# Altium footprint library 13-IC Packages-2smt4e.PcbLib: 49 footprints (part 1 of 4)
Each footprint in its own frame and in the unit in brackets; x right, y up, seen from the top. Pads: shape width x height; smd on the part's side, far side on the other; paste and mask are expansions set on the pad; w line width, h text height; cw(c..) or ccw(c..) is an arc to the next point about the centre after c.
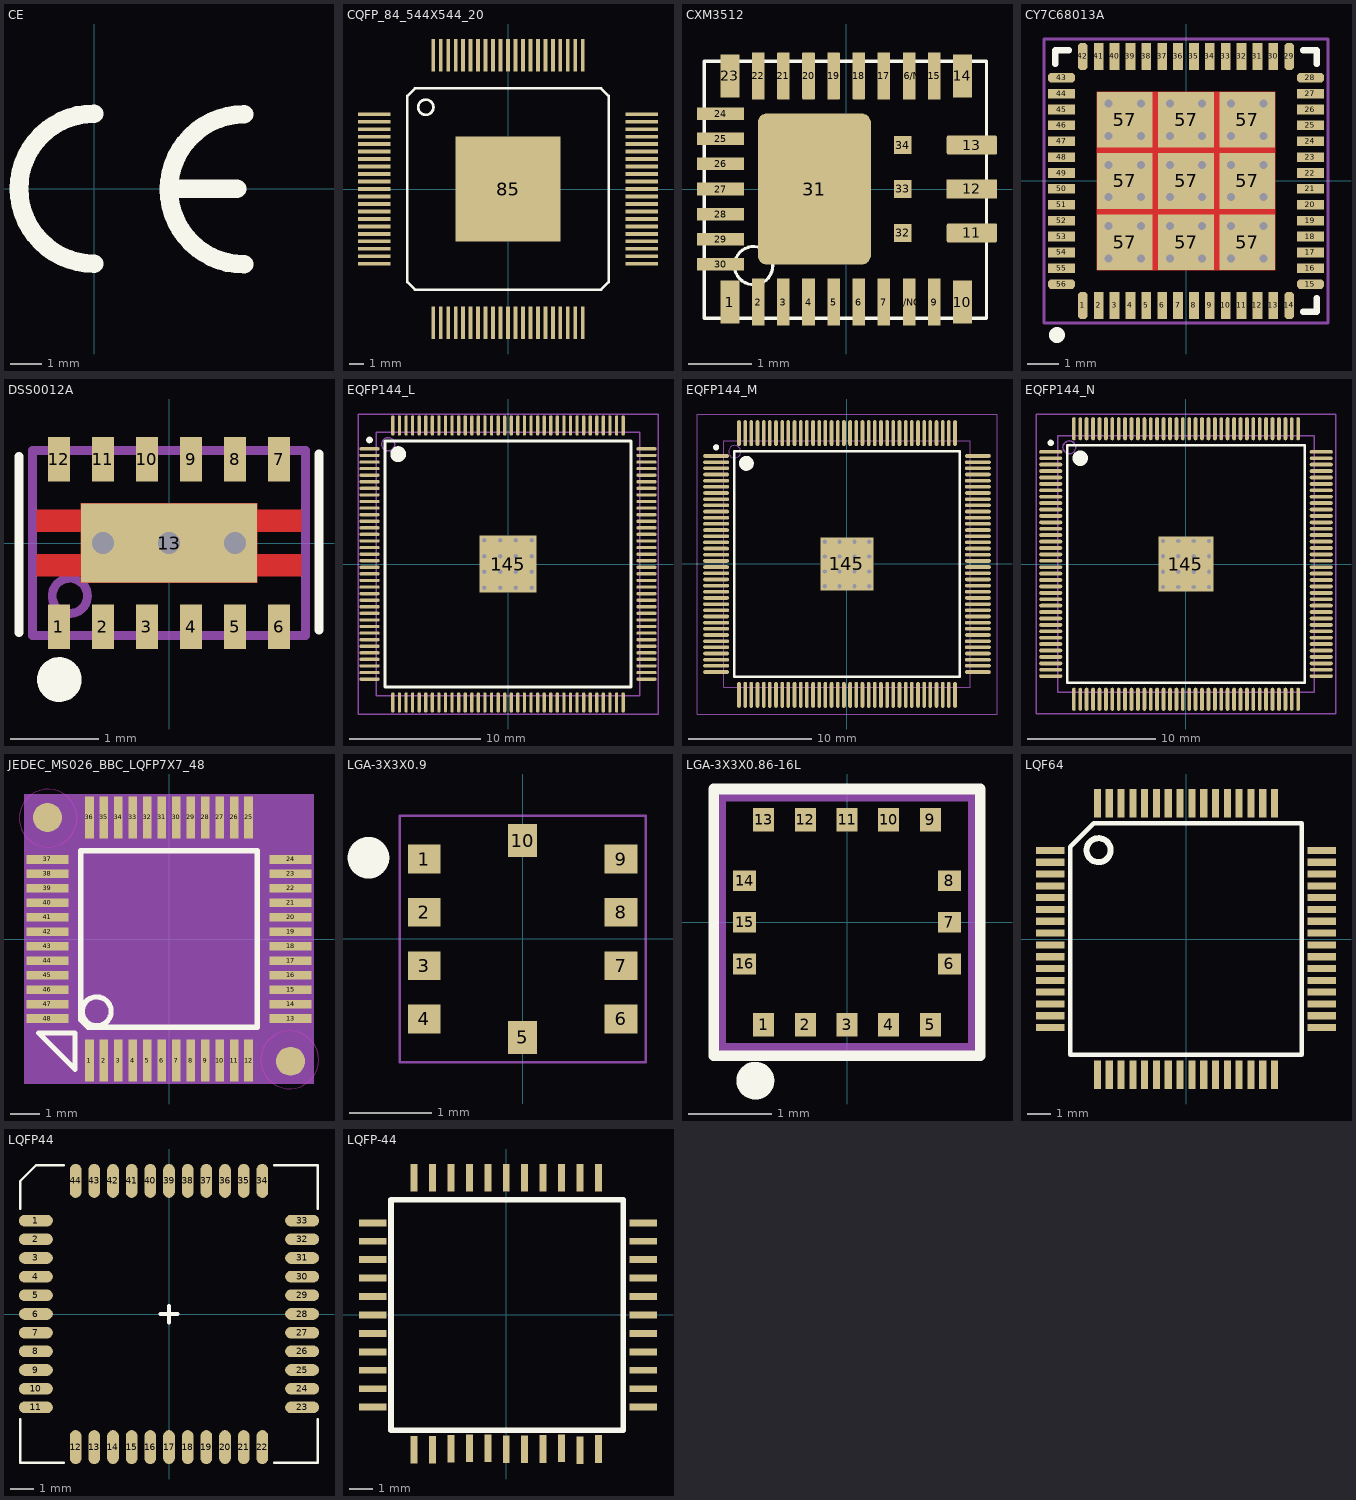
[diagram p0: the footprints below, top view; thin cyan lines are the x and y axes]

## CE [mm]
Top Overlay:
  lines w0.6: 0,-2.413 cw(c0,0) 0,2.413 ; 2.53,0 4.6,0 ; 4.826,-2.438 cw(c4.826,-0.025) 4.826,2.388
3D body "ce.stp": height 0.02, standoff 0, extent -2.725,-2.725 4.82,2.725

## CQFP_84_544X544_20 [mil] "CQFP_84_544X544_20"
pads (85):
  rect 85x10 smd mask+2.76: 1(-352.5,196.85) 2(-352.5,177.16) 3(-352.5,157.48) 4(-352.5,137.79) 5(-352.5,118.11) 6(-352.5,98.42) 7(-352.5,78.74) 8(-352.5,59.05) 9(-352.5,39.37) 10(-352.5,19.68) 11(-352.5,0) 12(-352.5,-19.68) 13(-352.5,-39.37) 14(-352.5,-59.05) 15(-352.5,-78.74) 16(-352.5,-98.42) 17(-352.5,-118.11) 18(-352.5,-137.79) 19(-352.5,-157.48) 20(-352.5,-177.16) 21(-352.5,-196.85) 43(352.5,-196.85) 44(352.5,-177.16) 45(352.5,-157.48) 46(352.5,-137.79) 47(352.5,-118.11) 48(352.5,-98.42) 49(352.5,-78.74) 50(352.5,-59.05) 51(352.5,-39.37) 52(352.5,-19.68) 53(352.5,0) 54(352.5,19.68) 55(352.5,39.37) 56(352.5,59.05) 57(352.5,78.74) 58(352.5,98.42) 59(352.5,118.11) 60(352.5,137.79) 61(352.5,157.48) 62(352.5,177.16) 63(352.5,196.85)
  rect 10x85 smd mask+2.76: 22(-196.85,-352.5) 23(-177.16,-352.5) 24(-157.48,-352.5) 25(-137.79,-352.5) 26(-118.11,-352.5) 27(-98.42,-352.5) 28(-78.74,-352.5) 29(-59.05,-352.5) 30(-39.37,-352.5) 31(-19.68,-352.5) 32(0,-352.5) 33(19.68,-352.5) 34(39.37,-352.5) 35(59.05,-352.5) 36(78.74,-352.5) 37(98.42,-352.5) 38(118.11,-352.5) 39(137.79,-352.5) 40(157.48,-352.5) 41(177.16,-352.5) 42(196.85,-352.5) 64(196.85,352.5) 65(177.16,352.5) 66(157.48,352.5) 67(137.79,352.5) 69(98.42,352.5) 70(78.74,352.5) 71(59.05,352.5) 72(39.37,352.5) 73(19.68,352.5) 74(0,352.5) 75(-19.68,352.5) 76(-39.37,352.5) 77(-59.05,352.5) 78(-78.74,352.5) 79(-98.42,352.5) 80(-118.11,352.5) 81(-137.79,352.5) 82(-157.48,352.5) 83(-177.16,352.5) 84(-196.85,352.5)
  rect 10x85 smd: 68(118.11,352.5)
  rect 277x277 smd mask+2.76: 85(0,0)
Top Overlay:
  circle w7: c-216.38,215.31 r20
  lines w7: -265,-245 -265,245 -245,265 245,265 265,245 265,-245 245,-265 -245,-265 -265,-245
Top Paste:
  pour cut-out: -130,-130 -130,-10 -10,-10 -10,-130
  pour cut-out: 10,-10 10,-130 130,-130 130,-10
  pour cut-out: 130,130 130,10 10,10 10,130
  pour cut-out: -10,10 -10,130 -130,130 -130,10
Mechanical 16:
  circle w1: c-217.16,216.1 r19.68
3D body "cqfp-84.stp": height 0.79, standoff 0, extent -202,-394.99 -192,-309.99
3D body "cqfp-84.stp": height 0.79, standoff 0, extent -182,-395 -172.01,-310
3D body "cqfp-84.stp": height 0.79, standoff 0, extent -162.5,-395 -152.51,-310
3D body "cqfp-84.stp": height 0.79, standoff 0, extent -143,-394.99 -133,-310
3D body "cqfp-84.stp": height 0.79, standoff 0, extent -123,-394.99 -113,-309.99
3D body "cqfp-84.stp": height 0.79, standoff 0, extent -103.5,-394.99 -93.5,-309.99
3D body "cqfp-84.stp": height 0.79, standoff 0, extent -84,-394.99 -74,-310
3D body "cqfp-84.stp": height 0.79, standoff 0, extent -64,-395 -54,-310
3D body "cqfp-84.stp": height 0.79, standoff 0, extent -44.5,-394.99 -34.5,-310
3D body "cqfp-84.stp": height 0.79, standoff 0, extent -25,-395 -15.01,-310
3D body "cqfp-84.stp": height 0.79, standoff 0, extent -5,-395 4.99,-310
3D body "cqfp-84.stp": height 0.79, standoff 0, extent 14.5,-394.99 24.5,-309.99
3D body "cqfp-84.stp": height 0.79, standoff 0, extent 34.5,-394.99 44.5,-309.99
3D body "cqfp-84.stp": height 0.79, standoff 0, extent 54,-395 63.99,-310
3D body "cqfp-84.stp": height 0.79, standoff 0, extent 73.5,-395 83.49,-310
3D body "cqfp-84.stp": height 0.79, standoff 0, extent 93.5,-395 103.5,-310
3D body "cqfp-84.stp": height 0.79, standoff 0, extent 113,-395 123,-310
3D body "cqfp-84.stp": height 0.79, standoff 0, extent 132.5,-394.99 142.5,-310
3D body "cqfp-84.stp": height 0.79, standoff 0, extent 152.5,-394.99 162.5,-310
3D body "cqfp-84.stp": height 0.79, standoff 0, extent 172,-394.99 182,-309.99
3D body "cqfp-84.stp": height 0.79, standoff 0, extent 192,-395 202,-310
3D body "cqfp-84.stp": height 0.79, standoff 0, extent 192,310.01 202,395.01
3D body "cqfp-84.stp": height 0.79, standoff 0, extent 172,310.01 182,395
3D body "cqfp-84.stp": height 0.79, standoff 0, extent 152.5,310.01 162.5,395.01
3D body "cqfp-84.stp": height 0.79, standoff 0, extent 133,310 142.99,395
3D body "cqfp-84.stp": height 0.79, standoff 0, extent 113,310.01 123,395.01
3D body "cqfp-84.stp": height 0.79, standoff 0, extent 93.5,310 103.5,395
3D body "cqfp-84.stp": height 0.79, standoff 0, extent 73.5,310 83.49,395
3D body "cqfp-84.stp": height 0.79, standoff 0, extent 54,310.01 64,395
3D body "cqfp-84.stp": height 0.79, standoff 0, extent 34.5,310 44.5,395
3D body "cqfp-84.stp": height 0.79, standoff 0, extent 14.5,310.01 24.49,395
3D body "cqfp-84.stp": height 0.79, standoff 0, extent -5,310 5,395
3D body "cqfp-84.stp": height 0.79, standoff 0, extent -24.5,310 -14.5,395
3D body "cqfp-84.stp": height 0.79, standoff 0, extent -44.5,310 -34.5,395
3D body "cqfp-84.stp": height 0.79, standoff 0, extent -64,310 -54,395
3D body "cqfp-84.stp": height 0.79, standoff 0, extent -83.5,310.01 -73.5,395
3D body "cqfp-84.stp": height 0.79, standoff 0, extent -103.5,310.01 -93.5,395
3D body "cqfp-84.stp": height 0.79, standoff 0, extent -123,310 -113.01,395
3D body "cqfp-84.stp": height 0.79, standoff 0, extent -142.5,310 -132.5,395
3D body "cqfp-84.stp": height 0.79, standoff 0, extent -162.5,310.01 -152.5,395.01
3D body "cqfp-84.stp": height 0.79, standoff 0, extent -182,310 -172,395
3D body "cqfp-84.stp": height 0.79, standoff 0, extent -201.5,310 -191.5,395
3D body "cqfp-84.stp": height 0.79, standoff 0, extent -395,192.01 -310,202
3D body "cqfp-84.stp": height 0.79, standoff 0, extent -394.99,172.01 -309.99,182.01
3D body "cqfp-84.stp": height 0.79, standoff 0, extent -395,152.51 -310,162.5
3D body "cqfp-84.stp": height 0.79, standoff 0, extent -395,132.5 -310,142.5
3D body "cqfp-84.stp": height 0.79, standoff 0, extent -394.99,113.01 -309.99,123
3D body "cqfp-84.stp": height 0.79, standoff 0, extent -395,93.51 -310,103.5
3D body "cqfp-84.stp": height 0.79, standoff 0, extent -395,74.01 -310,84
3D body "cqfp-84.stp": height 0.79, standoff 0, extent -395,54 -310,64
3D body "cqfp-84.stp": height 0.79, standoff 0, extent -394.99,34.51 -309.99,44.51
3D body "cqfp-84.stp": height 0.79, standoff 0, extent -395,14.5 -310,24.5
3D body "cqfp-84.stp": height 0.79, standoff 0, extent -395,-5 -310,5
3D body "cqfp-84.stp": height 0.79, standoff 0, extent -395,-24.5 -310,-14.5
3D body "cqfp-84.stp": height 0.79, standoff 0, extent -395,-44.5 -310,-34.5
3D body "cqfp-84.stp": height 0.79, standoff 0, extent -395,-63.99 -310,-54
3D body "cqfp-84.stp": height 0.79, standoff 0, extent -395,-83.49 -310,-73.5
3D body "cqfp-84.stp": height 0.79, standoff 0, extent -395,-103.5 -310,-93.5
3D body "cqfp-84.stp": height 0.79, standoff 0, extent -395,-123 -310,-113
3D body "cqfp-84.stp": height 0.79, standoff 0, extent -395,-142.99 -310,-133
3D body "cqfp-84.stp": height 0.79, standoff 0, extent -394.99,-162.49 -310,-152.5
3D body "cqfp-84.stp": height 0.79, standoff 0, extent -394.99,-181.99 -309.99,-171.99
3D body "cqfp-84.stp": height 0.79, standoff 0, extent -395,-201.99 -310,-192
3D body "cqfp-84.stp": height 0.79, standoff 0, extent 310,-201.99 395,-192
3D body "cqfp-84.stp": height 0.79, standoff 0, extent 310,-182 395,-172
3D body "cqfp-84.stp": height 0.79, standoff 0, extent 310.01,-162.49 395.01,-152.5
3D body "cqfp-84.stp": height 0.79, standoff 0, extent 310.01,-142.99 395.01,-132.99
3D body "cqfp-84.stp": height 0.79, standoff 0, extent 310,-122.99 395,-113
3D body "cqfp-84.stp": height 0.79, standoff 0, extent 310,-103.49 395,-93.5
3D body "cqfp-84.stp": height 0.79, standoff 0, extent 310,-83.5 395,-73.5
3D body "cqfp-84.stp": height 0.79, standoff 0, extent 310,-64 395,-54
3D body "cqfp-84.stp": height 0.79, standoff 0, extent 310,-44.49 395,-34.5
3D body "cqfp-84.stp": height 0.79, standoff 0, extent 310.01,-24.49 395,-14.49
3D body "cqfp-84.stp": height 0.79, standoff 0, extent 310,-4.99 395,5
3D body "cqfp-84.stp": height 0.79, standoff 0, extent 310,14.51 395,24.5
3D body "cqfp-84.stp": height 0.79, standoff 0, extent 310,34.51 395,44.5
3D body "cqfp-84.stp": height 0.79, standoff 0, extent 310,54 395,64
3D body "cqfp-84.stp": height 0.79, standoff 0, extent 310,73.5 395,83.5
3D body "cqfp-84.stp": height 0.79, standoff 0, extent 310.01,93.51 395,103.51
3D body "cqfp-84.stp": height 0.79, standoff 0, extent 310,113 395,123
3D body "cqfp-84.stp": height 0.79, standoff 0, extent 310,133.01 395,143
3D body "cqfp-84.stp": height 0.79, standoff 0, extent 310,152.5 395,162.5
3D body "cqfp-84.stp": height 0.79, standoff 0, extent 310,172 395,182
3D body "cqfp-84.stp": height 0.79, standoff 0, extent 310,192 395,202
3D body "ads1278.stp": height 122.8, standoff -0.59, extent -388.87,-388.87 389.87,389.87

## CXM3512 [mm]
pads (34):
  rect 0.3x0.68 smd mask+0.051: 1(-1.85,-1.8) 10(1.85,-1.8) 14(1.85,1.8) 23(-1.85,1.8)
  rect 0.2x0.75 smd mask+0.051: 2(-1.4,-1.8) 3(-1,-1.8) 4(-0.6,-1.8) 5(-0.2,-1.8) 6(0.2,-1.8) 7(0.6,-1.8) 8/NC(1,-1.8) 9(1.4,-1.8) 15(1.4,1.8) 16/N(1,1.8) 17(0.6,1.8) 22(-1.4,1.8)
  rrect15% 0.8x0.3 smd: 11(2,-0.7) 13(2,0.7)
  rect 0.8x0.3 smd mask+0.051: 12(2,0)
  rrect15% 0.2x0.75 smd mask+0.051: 18(0.2,1.8) 19(-0.2,1.8) 20(-0.6,1.8) 21(-1,1.8)
  rect 0.75x0.2 smd mask+0.051: 24(-2,1.2) 25(-2,0.8) 26(-2,0.4) 27(-2,0) 28(-2,-0.4) 29(-2,-0.8) 30(-2,-1.2)
  rrect15% 1.8x2.4 smd mask+0.051: 31(-0.508,0)
  rect 0.285x0.285 smd: 32(0.9,-0.7) 34(0.9,0.7)
  rect 0.285x0.285 smd mask+0.051: 33(0.9,0)
Top Overlay:
  circle w0.051: c-1.473,-1.219 r0.305
  lines w0.051: -2.261,-2.057 2.235,-2.057 2.235,2.032 -2.261,2.032 -2.261,-2.057
3D body "cxm3512eq.stp": height 1.15, standoff -0.1, extent -2.216,-2.019 2.184,1.981

## CY7C68013A [mm]
pads (65):
  oct 0.305x0.86 smd mask+0.051: 1(-3.25,-3.92) 14(3.25,-3.92) 29(3.25,3.92) 42(-3.25,3.92)
  rect 0.305x0.86 smd mask+0.038: 2(-2.75,-3.92) 3(-2.25,-3.92) 4(-1.75,-3.92) 5(-1.25,-3.92) 6(-0.75,-3.92) 7(-0.25,-3.92) 8(0.25,-3.92) 9(0.75,-3.92) 10(1.25,-3.92) 11(1.75,-3.92) 12(2.25,-3.92) 13(2.75,-3.92) 30(2.75,3.92) 31(2.25,3.92) 32(1.75,3.92) 33(1.25,3.92) 34(0.75,3.92) 35(0.25,3.92) 36(-0.25,3.92) 37(-0.75,3.92) 38(-1.25,3.92) 39(-1.75,3.92) 40(-2.25,3.92) 41(-2.75,3.92)
  oct 0.86x0.305 smd mask+0.051: 15(3.92,-3.25) 28(3.92,3.25) 43(-3.92,3.25) 56(-3.92,-3.25)
  rect 0.86x0.305 smd mask+0.038: 16(3.92,-2.75) 17(3.92,-2.25) 18(3.92,-1.75) 19(3.92,-1.25) 20(3.92,-0.75) 21(3.92,-0.25) 22(3.92,0.25) 23(3.92,0.75) 24(3.92,1.25) 25(3.92,1.75) 26(3.92,2.25) 27(3.92,2.75) 44(-3.92,2.75) 45(-3.92,2.25) 46(-3.92,1.75) 47(-3.92,1.25) 48(-3.92,0.75) 49(-3.92,0.25) 50(-3.92,-0.25) 51(-3.92,-0.75) 52(-3.92,-1.25) 53(-3.92,-1.75) 54(-3.92,-2.25) 55(-3.92,-2.75)
  rect 1.75x1.75 smd mask+0.038: 57(-1.93,-1.93) 57(-1.93,1.93) 57(-1.93,0) 57(0,-1.93) 57(0,0) 57(0,1.93) 57(1.93,-1.93) 57(1.93,0) 57(1.93,1.93)
via -2.438,-1.422 diameter 0.584 hole 0.25
via -1.422,-1.422 diameter 0.584 hole 0.25
via -2.438,-2.438 diameter 0.584 hole 0.25
via -1.422,-2.438 diameter 0.584 hole 0.25
via -0.508,-1.422 diameter 0.584 hole 0.25
via 0.508,-1.422 diameter 0.584 hole 0.25
via -0.508,-2.438 diameter 0.584 hole 0.25
via 0.508,-2.438 diameter 0.584 hole 0.25
via 1.422,-1.422 diameter 0.584 hole 0.25
via 2.438,-1.422 diameter 0.584 hole 0.25
via 1.422,-2.438 diameter 0.584 hole 0.25
via 2.438,-2.438 diameter 0.584 hole 0.25
via 1.422,0.508 diameter 0.584 hole 0.25
via 2.438,0.508 diameter 0.584 hole 0.25
via 1.422,-0.508 diameter 0.584 hole 0.25
via 2.438,-0.508 diameter 0.584 hole 0.25
via 1.422,2.438 diameter 0.584 hole 0.25
via 2.438,2.438 diameter 0.584 hole 0.25
via 1.422,1.422 diameter 0.584 hole 0.25
via 2.438,1.422 diameter 0.584 hole 0.25
via -0.508,2.438 diameter 0.584 hole 0.25
via 0.508,2.438 diameter 0.584 hole 0.25
via -0.508,1.422 diameter 0.584 hole 0.25
via 0.508,1.422 diameter 0.584 hole 0.25
via -2.438,2.438 diameter 0.584 hole 0.25
via -1.422,2.438 diameter 0.584 hole 0.25
via -2.438,1.422 diameter 0.584 hole 0.25
via -1.422,1.422 diameter 0.584 hole 0.25
via -2.438,0.508 diameter 0.584 hole 0.25
via -1.422,0.508 diameter 0.584 hole 0.25
via -2.438,-0.508 diameter 0.584 hole 0.25
via -1.422,-0.508 diameter 0.584 hole 0.25
via 0.508,-0.508 diameter 0.584 hole 0.25
via -0.508,-0.508 diameter 0.584 hole 0.25
via 0.508,0.508 diameter 0.584 hole 0.25
via -0.508,0.508 diameter 0.584 hole 0.25
Top Layer:
  rectangle: -2.819,-2.82 2.819,2.819
Top Overlay:
  circle w0.25: c-4.064,-4.851 r0.125
  lines w0.2: -4.115,3.683 -4.115,4.115 -3.683,4.115 ; 3.683,-4.115 4.115,-4.115 4.115,-3.683 ; 3.683,4.115 4.115,4.115 4.115,3.683
Mechanical 7:
  lines w0.1: -4.47,-4.47 -4.47,4.47 4.47,4.47 4.47,-4.47 -4.47,-4.47
3D body "qfn_56.stp": height 2, standoff 0, extent -4.01,-4.009 4.01,4.009
3D body "0_305-0_86.stp": height 0.01, standoff 0, extent -4.35,3.098 -3.49,3.403
3D body "0_305-0_86.stp": height 0.01, standoff 0, extent -4.35,2.598 -3.49,2.903
3D body "0_305-0_86.stp": height 0.01, standoff 0, extent -4.35,2.098 -3.49,2.403
3D body "0_305-0_86.stp": height 0.01, standoff 0, extent -4.35,1.598 -3.49,1.903
3D body "0_305-0_86.stp": height 0.01, standoff 0, extent -4.35,1.098 -3.49,1.403
3D body "0_305-0_86.stp": height 0.01, standoff 0, extent -4.35,0.598 -3.49,0.903
3D body "0_305-0_86.stp": height 0.01, standoff 0, extent -4.35,0.098 -3.49,0.403
3D body "0_305-0_86.stp": height 0.01, standoff 0, extent -4.35,-0.402 -3.49,-0.097
3D body "0_305-0_86.stp": height 0.01, standoff 0, extent -4.35,-0.902 -3.49,-0.597
3D body "0_305-0_86.stp": height 0.01, standoff 0, extent -4.35,-1.402 -3.49,-1.097
3D body "0_305-0_86.stp": height 0.01, standoff 0, extent -4.35,-1.902 -3.49,-1.597
3D body "0_305-0_86.stp": height 0.01, standoff 0, extent -4.35,-2.402 -3.49,-2.097
3D body "0_305-0_86.stp": height 0.01, standoff 0, extent -4.35,-2.902 -3.49,-2.597
3D body "0_305-0_86.stp": height 0.01, standoff 0, extent -4.35,-3.402 -3.49,-3.097
3D body "0_305-0_86.stp": height 0.01, standoff 0, extent -3.403,-4.35 -3.098,-3.49
3D body "0_305-0_86.stp": height 0.01, standoff 0, extent -2.903,-4.35 -2.598,-3.49
3D body "0_305-0_86.stp": height 0.01, standoff 0, extent -2.403,-4.35 -2.098,-3.49
3D body "0_305-0_86.stp": height 0.01, standoff 0, extent -1.903,-4.35 -1.598,-3.49
3D body "0_305-0_86.stp": height 0.01, standoff 0, extent -1.403,-4.35 -1.098,-3.49
3D body "0_305-0_86.stp": height 0.01, standoff 0, extent -0.903,-4.35 -0.598,-3.49
3D body "0_305-0_86.stp": height 0.01, standoff 0, extent -0.403,-4.35 -0.098,-3.49
3D body "0_305-0_86.stp": height 0.01, standoff 0, extent 0.097,-4.35 0.402,-3.49
3D body "0_305-0_86.stp": height 0.01, standoff 0, extent 0.597,-4.35 0.902,-3.49
3D body "0_305-0_86.stp": height 0.01, standoff 0, extent 1.097,-4.35 1.402,-3.49
3D body "0_305-0_86.stp": height 0.01, standoff 0, extent 1.597,-4.35 1.902,-3.49
3D body "0_305-0_86.stp": height 0.01, standoff 0, extent 2.097,-4.35 2.402,-3.49
3D body "0_305-0_86.stp": height 0.01, standoff 0, extent 2.597,-4.35 2.902,-3.49
3D body "0_305-0_86.stp": height 0.01, standoff 0, extent 3.097,-4.35 3.402,-3.49
3D body "0_305-0_86.stp": height 0.01, standoff 0, extent 3.49,-3.403 4.35,-3.098
3D body "0_305-0_86.stp": height 0.01, standoff 0, extent 3.49,-3.403 4.35,-3.098
3D body "0_305-0_86.stp": height 0.01, standoff 0, extent 3.49,-2.403 4.35,-2.098
3D body "0_305-0_86.stp": height 0.01, standoff 0, extent 3.49,-1.903 4.35,-1.598
3D body "0_305-0_86.stp": height 0.01, standoff 0, extent 3.49,-1.403 4.35,-1.098
3D body "0_305-0_86.stp": height 0.01, standoff 0, extent 3.49,-0.903 4.35,-0.598
3D body "0_305-0_86.stp": height 0.01, standoff 0, extent 3.49,-0.403 4.35,-0.098
3D body "0_305-0_86.stp": height 0.01, standoff 0, extent 3.49,0.097 4.35,0.402
3D body "0_305-0_86.stp": height 0.01, standoff 0, extent 3.49,0.597 4.35,0.902
3D body "0_305-0_86.stp": height 0.01, standoff 0, extent 3.49,1.097 4.35,1.402
3D body "0_305-0_86.stp": height 0.01, standoff 0, extent 3.49,1.597 4.35,1.902
3D body "0_305-0_86.stp": height 0.01, standoff 0, extent 3.49,2.097 4.35,2.402
3D body "0_305-0_86.stp": height 0.01, standoff 0, extent 3.49,2.597 4.35,2.902
3D body "0_305-0_86.stp": height 0.01, standoff 0, extent 3.49,3.097 4.35,3.402
3D body "0_305-0_86.stp": height 0.01, standoff 0, extent 3.098,3.49 3.403,4.35
3D body "0_305-0_86.stp": height 0.01, standoff 0, extent 2.598,3.49 2.903,4.35
3D body "0_305-0_86.stp": height 0.01, standoff 0, extent 2.098,3.49 2.403,4.35
3D body "0_305-0_86.stp": height 0.01, standoff 0, extent 1.598,3.49 1.903,4.35
3D body "0_305-0_86.stp": height 0.01, standoff 0, extent 1.098,3.49 1.403,4.35
3D body "0_305-0_86.stp": height 0.01, standoff 0, extent 0.598,3.49 0.903,4.35
3D body "0_305-0_86.stp": height 0.01, standoff 0, extent 0.098,3.49 0.403,4.35
3D body "0_305-0_86.stp": height 0.01, standoff 0, extent -0.402,3.49 -0.097,4.35
3D body "0_305-0_86.stp": height 0.01, standoff 0, extent -0.902,3.49 -0.597,4.35
3D body "0_305-0_86.stp": height 0.01, standoff 0, extent -1.402,3.49 -1.097,4.35
3D body "0_305-0_86.stp": height 0.01, standoff 0, extent -1.902,3.49 -1.597,4.35
3D body "0_305-0_86.stp": height 0.01, standoff 0, extent -2.402,3.49 -2.097,4.35
3D body "0_305-0_86.stp": height 0.01, standoff 0, extent -2.902,3.49 -2.597,4.35
3D body "0_305-0_86.stp": height 0.01, standoff 0, extent -3.402,3.49 -3.097,4.35
3D body "0_305-0_86.stp": height 0.01, standoff 0, extent 3.49,-2.903 4.35,-2.598

## DSS0012A [mm]
pads (13):
  rect 0.25x0.5 smd: 1(-1.25,-0.95) 2(-0.75,-0.95) 3(-0.25,-0.95) 4(0.25,-0.95) 5(0.75,-0.95) 6(1.25,-0.95) 7(1.25,0.95) 8(0.75,0.95) 9(0.25,0.95) 10(-0.25,0.95) 11(-0.75,0.95) 12(-1.25,0.95)
  rect 2x0.9 smd paste-0.45: 13(0,0)
via 0,0 diameter 0.5 hole 0.25
via -0.75,0 diameter 0.5 hole 0.25
via 0.75,0 diameter 0.5 hole 0.25
Top Layer:
  region: 1.5,-0.375 1,-0.375 1,-0.45 -1,-0.45 -1,-0.375 -1.5,-0.375 -1.5,-0.125 -1,-0.125 -1,0.125 -1.5,0.125 -1.5,0.375 -1,0.375 -1,0.45 1,0.45 1,0.375 1.5,0.375 1.5,0.125 1,0.125 1,-0.125 1.5,-0.125
Top Overlay:
  circle w0.254: c-1.245,-1.549 r0.127
  lines w0.1: -1.702,-1.016 -1.702,0.984 ; 1.702,-0.991 1.702,1.009
Top Paste:
  region: 0.894,-0.427 0.894,0.427 -0.895,0.427 -0.895,-0.427
Mechanical 15:
  circle w0.1: c-1.125,-0.6 r0.2
  lines w0.1: -1.55,-1.05 1.55,-1.05 1.55,1.05 -1.55,1.05 -1.55,-1.05
3D body: height 0.81, standoff 0.5, extent -1.324,-0.799 -0.926,-0.401
3D body "DSS0012A.stp": height 0.8, standoff 0, extent -1.5,-1 1.5,1

## EQFP144_L [mm] "Thin QFP, 144-Leads, Body 20x20mm, Pitch 0.5mm, IPC High Density"
height 1.6
pads (145):
  oval 1.55x0.25 smd: 1(-10.525,8.75) 2(-10.525,8.25) 3(-10.525,7.75) 4(-10.525,7.25) 5(-10.525,6.75) 6(-10.525,6.25) 7(-10.525,5.75) 8(-10.525,5.25) 9(-10.525,4.75) 10(-10.525,4.25) 11(-10.525,3.75) 12(-10.525,3.25) 13(-10.525,2.75) 14(-10.525,2.25) 15(-10.525,1.75) 16(-10.525,1.25) 17(-10.525,0.75) 18(-10.525,0.25) 19(-10.525,-0.25) 20(-10.525,-0.75) 21(-10.525,-1.25) 22(-10.525,-1.75) 23(-10.525,-2.25) 24(-10.525,-2.75) 25(-10.525,-3.25) 26(-10.525,-3.75) 27(-10.525,-4.25) 28(-10.525,-4.75) 29(-10.525,-5.25) 30(-10.525,-5.75) 31(-10.525,-6.25) 32(-10.525,-6.75) 33(-10.525,-7.25) 34(-10.525,-7.75) 35(-10.525,-8.25) 36(-10.525,-8.75) 73(10.525,-8.75) 74(10.525,-8.25) 75(10.525,-7.75) 76(10.525,-7.25) 77(10.525,-6.75) 78(10.525,-6.25) 79(10.525,-5.75) 80(10.525,-5.25) 81(10.525,-4.75) 82(10.525,-4.25) 83(10.525,-3.75) 84(10.525,-3.25) 85(10.525,-2.75) 86(10.525,-2.25) 87(10.525,-1.75) 88(10.525,-1.25) 89(10.525,-0.75) 90(10.525,-0.25) 91(10.525,0.25) 92(10.525,0.75) 93(10.525,1.25) 94(10.525,1.75) 95(10.525,2.25) 96(10.525,2.75) 97(10.525,3.25) 98(10.525,3.75) 99(10.525,4.25) 100(10.525,4.75) 101(10.525,5.25) 102(10.525,5.75) 103(10.525,6.25) 104(10.525,6.75) 105(10.525,7.25) 106(10.525,7.75) 107(10.525,8.25) 108(10.525,8.75)
  oval 0.25x1.55 smd: 37(-8.75,-10.525) 38(-8.25,-10.525) 39(-7.75,-10.525) 40(-7.25,-10.525) 41(-6.75,-10.525) 42(-6.25,-10.525) 43(-5.75,-10.525) 44(-5.25,-10.525) 45(-4.75,-10.525) 46(-4.25,-10.525) 47(-3.75,-10.525) 48(-3.25,-10.525) 49(-2.75,-10.525) 50(-2.25,-10.525) 51(-1.75,-10.525) 52(-1.25,-10.525) 53(-0.75,-10.525) 54(-0.25,-10.525) 55(0.25,-10.525) 56(0.75,-10.525) 57(1.25,-10.525) 58(1.75,-10.525) 59(2.25,-10.525) 60(2.75,-10.525) 61(3.25,-10.525) 62(3.75,-10.525) 63(4.25,-10.525) 64(4.75,-10.525) 65(5.25,-10.525) 66(5.75,-10.525) 67(6.25,-10.525) 68(6.75,-10.525) 69(7.25,-10.525) 70(7.75,-10.525) 71(8.25,-10.525) 72(8.75,-10.525) 109(8.75,10.525) 110(8.25,10.525) 111(7.75,10.525) 112(7.25,10.525) 113(6.75,10.525) 114(6.25,10.525) 115(5.75,10.525) 116(5.25,10.525) 117(4.75,10.525) 118(4.25,10.525) 119(3.75,10.525) 120(3.25,10.525) 121(2.75,10.525) 122(2.25,10.525) 123(1.75,10.525) 124(1.25,10.525) 125(0.75,10.525) 126(0.25,10.525) 127(-0.25,10.525) 128(-0.75,10.525) 129(-1.25,10.525) 130(-1.75,10.525) 131(-2.25,10.525) 132(-2.75,10.525) 133(-3.25,10.525) 134(-3.75,10.525) 135(-4.25,10.525) 136(-4.75,10.525) 137(-5.25,10.525) 138(-5.75,10.525) 139(-6.25,10.525) 140(-6.75,10.525) 141(-7.25,10.525) 142(-7.75,10.525) 143(-8.25,10.525) 144(-8.75,10.525)
  rect 4.3x4.3 smd: 145(0,0)
via 1.8,-1.8 diameter 0.66 hole 0.33
via 0.6,-1.8 diameter 0.66 hole 0.33
via -0.6,-1.8 diameter 0.66 hole 0.33
via -1.8,-1.8 diameter 0.66 hole 0.33
via 1.8,-0.6 diameter 0.66 hole 0.33
via 0.6,-0.6 diameter 0.66 hole 0.33
via -0.6,-0.6 diameter 0.66 hole 0.33
via -1.8,-0.6 diameter 0.66 hole 0.33
via 1.8,0.6 diameter 0.66 hole 0.33
via 0.6,0.6 diameter 0.66 hole 0.33
via -0.6,0.6 diameter 0.66 hole 0.33
via -1.8,0.6 diameter 0.66 hole 0.33
via 1.8,1.8 diameter 0.66 hole 0.33
via 0.6,1.8 diameter 0.66 hole 0.33
via -0.6,1.8 diameter 0.66 hole 0.33
via -1.8,1.8 diameter 0.66 hole 0.33
Top Overlay:
  circle w0.6: c-8.35,8.35 r0.3
  circle w0.25: c-10.525,9.425 r0.125
  lines w0.2: -9.35,-9.35 9.35,-9.35 9.35,9.35 -9.35,9.35 -9.35,-9.35
Mechanical 13:
  circle w0.1: c-9.1,9.1 r0.5
  lines w0.1: -10,-10 10,-10 10,10 -10,10 -10,-10
Mechanical 15:
  lines w0.1: -0.5,0 0.5,0 ; 0,-0.5 0,0.5 ; -11.4,-11.4 11.4,-11.4 11.4,11.4 -11.4,11.4 -11.4,-11.4
3D body "quad144.stp": height 1.5, standoff 0, extent -10.995,-10.998 11.005,11.002

## EQFP144_M [mm] "Thin QFP, 144-Leads, Body 20x20mm, Pitch 0.5mm, IPC Low Density"
height 1.6
pads (145):
  oval 2.1x0.3 smd: 1(-10.6,8.75) 2(-10.6,8.25) 3(-10.6,7.75) 4(-10.6,7.25) 5(-10.6,6.75) 6(-10.6,6.25) 7(-10.6,5.75) 8(-10.6,5.25) 9(-10.6,4.75) 10(-10.6,4.25) 11(-10.6,3.75) 12(-10.6,3.25) 13(-10.6,2.75) 14(-10.6,2.25) 15(-10.6,1.75) 16(-10.6,1.25) 17(-10.6,0.75) 18(-10.6,0.25) 19(-10.6,-0.25) 20(-10.6,-0.75) 21(-10.6,-1.25) 22(-10.6,-1.75) 23(-10.6,-2.25) 24(-10.6,-2.75) 25(-10.6,-3.25) 26(-10.6,-3.75) 27(-10.6,-4.25) 28(-10.6,-4.75) 29(-10.6,-5.25) 30(-10.6,-5.75) 31(-10.6,-6.25) 32(-10.6,-6.75) 33(-10.6,-7.25) 34(-10.6,-7.75) 35(-10.6,-8.25) 36(-10.6,-8.75) 73(10.6,-8.75) 74(10.6,-8.25) 75(10.6,-7.75) 76(10.6,-7.25) 77(10.6,-6.75) 78(10.6,-6.25) 79(10.6,-5.75) 80(10.6,-5.25) 81(10.6,-4.75) 82(10.6,-4.25) 83(10.6,-3.75) 84(10.6,-3.25) 85(10.6,-2.75) 86(10.6,-2.25) 87(10.6,-1.75) 88(10.6,-1.25) 89(10.6,-0.75) 90(10.6,-0.25) 91(10.6,0.25) 92(10.6,0.75) 93(10.6,1.25) 94(10.6,1.75) 95(10.6,2.25) 96(10.6,2.75) 97(10.6,3.25) 98(10.6,3.75) 99(10.6,4.25) 100(10.6,4.75) 101(10.6,5.25) 102(10.6,5.75) 103(10.6,6.25) 104(10.6,6.75) 105(10.6,7.25) 106(10.6,7.75) 107(10.6,8.25) 108(10.6,8.75)
  oval 0.3x2.1 smd: 37(-8.75,-10.6) 38(-8.25,-10.6) 39(-7.75,-10.6) 40(-7.25,-10.6) 41(-6.75,-10.6) 42(-6.25,-10.6) 43(-5.75,-10.6) 44(-5.25,-10.6) 45(-4.75,-10.6) 46(-4.25,-10.6) 47(-3.75,-10.6) 48(-3.25,-10.6) 49(-2.75,-10.6) 50(-2.25,-10.6) 51(-1.75,-10.6) 52(-1.25,-10.6) 53(-0.75,-10.6) 54(-0.25,-10.6) 55(0.25,-10.6) 56(0.75,-10.6) 57(1.25,-10.6) 58(1.75,-10.6) 59(2.25,-10.6) 60(2.75,-10.6) 61(3.25,-10.6) 62(3.75,-10.6) 63(4.25,-10.6) 64(4.75,-10.6) 65(5.25,-10.6) 66(5.75,-10.6) 67(6.25,-10.6) 68(6.75,-10.6) 69(7.25,-10.6) 70(7.75,-10.6) 71(8.25,-10.6) 72(8.75,-10.6) 109(8.75,10.6) 110(8.25,10.6) 111(7.75,10.6) 112(7.25,10.6) 113(6.75,10.6) 114(6.25,10.6) 115(5.75,10.6) 116(5.25,10.6) 117(4.75,10.6) 118(4.25,10.6) 119(3.75,10.6) 120(3.25,10.6) 121(2.75,10.6) 122(2.25,10.6) 123(1.75,10.6) 124(1.25,10.6) 125(0.75,10.6) 126(0.25,10.6) 127(-0.25,10.6) 128(-0.75,10.6) 129(-1.25,10.6) 130(-1.75,10.6) 131(-2.25,10.6) 132(-2.75,10.6) 133(-3.25,10.6) 134(-3.75,10.6) 135(-4.25,10.6) 136(-4.75,10.6) 137(-5.25,10.6) 138(-5.75,10.6) 139(-6.25,10.6) 140(-6.75,10.6) 141(-7.25,10.6) 142(-7.75,10.6) 143(-8.25,10.6) 144(-8.75,10.6)
  rect 4.3x4.3 smd: 145(0,0)
via 1.8,-1.8 diameter 0.66 hole 0.33
via 0.6,-1.8 diameter 0.66 hole 0.33
via -0.6,-1.8 diameter 0.66 hole 0.33
via -1.8,-1.8 diameter 0.66 hole 0.33
via 1.8,-0.6 diameter 0.66 hole 0.33
via 0.6,-0.6 diameter 0.66 hole 0.33
via -0.6,-0.6 diameter 0.66 hole 0.33
via -1.8,-0.6 diameter 0.66 hole 0.33
via 1.8,0.6 diameter 0.66 hole 0.33
via 0.6,0.6 diameter 0.66 hole 0.33
via -0.6,0.6 diameter 0.66 hole 0.33
via -1.8,0.6 diameter 0.66 hole 0.33
via 1.8,1.8 diameter 0.66 hole 0.33
via 0.6,1.8 diameter 0.66 hole 0.33
via -0.6,1.8 diameter 0.66 hole 0.33
via -1.8,1.8 diameter 0.66 hole 0.33
Top Overlay:
  circle w0.25: c-10.6,9.45 r0.125
  circle w0.6: c-8.15,8.15 r0.3
  lines w0.2: -9.15,-9.15 -9.15,9.15 9.15,9.15 9.15,-9.15 -9.15,-9.15
Mechanical 13:
  circle w0.1: c-9.1,9.1 r0.5
  lines w0.1: -10,-10 -10,10 10,10 10,-10 -10,-10
Mechanical 15:
  lines w0.1: -0.5,0 0.5,0 ; 0,-0.5 0,0.5 ; -12.15,-12.15 -12.15,12.15 12.15,12.15 12.15,-12.15 -12.15,-12.15
3D body "quad144.stp": height 1.5, standoff 0, extent -10.995,-10.998 11.005,11.002

## EQFP144_N [mm] "Thin QFP, 144-Leads, Body 20x20mm, Pitch 0.5mm, IPC Medium Density"
height 1.6
pads (145):
  oval 1.8x0.3 smd: 1(-10.55,8.75) 2(-10.55,8.25) 3(-10.55,7.75) 4(-10.55,7.25) 5(-10.55,6.75) 6(-10.55,6.25) 7(-10.55,5.75) 8(-10.55,5.25) 9(-10.55,4.75) 10(-10.55,4.25) 11(-10.55,3.75) 12(-10.55,3.25) 13(-10.55,2.75) 14(-10.55,2.25) 15(-10.55,1.75) 16(-10.55,1.25) 17(-10.55,0.75) 18(-10.55,0.25) 19(-10.55,-0.25) 20(-10.55,-0.75) 21(-10.55,-1.25) 22(-10.55,-1.75) 23(-10.55,-2.25) 24(-10.55,-2.75) 25(-10.55,-3.25) 26(-10.55,-3.75) 27(-10.55,-4.25) 28(-10.55,-4.75) 29(-10.55,-5.25) 30(-10.55,-5.75) 31(-10.55,-6.25) 32(-10.55,-6.75) 33(-10.55,-7.25) 34(-10.55,-7.75) 35(-10.55,-8.25) 36(-10.55,-8.75) 73(10.55,-8.75) 74(10.55,-8.25) 75(10.55,-7.75) 76(10.55,-7.25) 77(10.55,-6.75) 78(10.55,-6.25) 79(10.55,-5.75) 80(10.55,-5.25) 81(10.55,-4.75) 82(10.55,-4.25) 83(10.55,-3.75) 84(10.55,-3.25) 85(10.55,-2.75) 86(10.55,-2.25) 87(10.55,-1.75) 88(10.55,-1.25) 89(10.55,-0.75) 90(10.55,-0.25) 91(10.55,0.25) 92(10.55,0.75) 93(10.55,1.25) 94(10.55,1.75) 95(10.55,2.25) 96(10.55,2.75) 97(10.55,3.25) 98(10.55,3.75) 99(10.55,4.25) 100(10.55,4.75) 101(10.55,5.25) 102(10.55,5.75) 103(10.55,6.25) 104(10.55,6.75) 105(10.55,7.25) 106(10.55,7.75) 107(10.55,8.25) 108(10.55,8.75)
  oval 0.3x1.8 smd: 37(-8.75,-10.55) 38(-8.25,-10.55) 39(-7.75,-10.55) 40(-7.25,-10.55) 41(-6.75,-10.55) 42(-6.25,-10.55) 43(-5.75,-10.55) 44(-5.25,-10.55) 45(-4.75,-10.55) 46(-4.25,-10.55) 47(-3.75,-10.55) 48(-3.25,-10.55) 49(-2.75,-10.55) 50(-2.25,-10.55) 51(-1.75,-10.55) 52(-1.25,-10.55) 53(-0.75,-10.55) 54(-0.25,-10.55) 55(0.25,-10.55) 56(0.75,-10.55) 57(1.25,-10.55) 58(1.75,-10.55) 59(2.25,-10.55) 60(2.75,-10.55) 61(3.25,-10.55) 62(3.75,-10.55) 63(4.25,-10.55) 64(4.75,-10.55) 65(5.25,-10.55) 66(5.75,-10.55) 67(6.25,-10.55) 68(6.75,-10.55) 69(7.25,-10.55) 70(7.75,-10.55) 71(8.25,-10.55) 72(8.75,-10.55) 109(8.75,10.55) 110(8.25,10.55) 111(7.75,10.55) 112(7.25,10.55) 113(6.75,10.55) 114(6.25,10.55) 115(5.75,10.55) 116(5.25,10.55) 117(4.75,10.55) 118(4.25,10.55) 119(3.75,10.55) 120(3.25,10.55) 121(2.75,10.55) 122(2.25,10.55) 123(1.75,10.55) 124(1.25,10.55) 125(0.75,10.55) 126(0.25,10.55) 127(-0.25,10.55) 128(-0.75,10.55) 129(-1.25,10.55) 130(-1.75,10.55) 131(-2.25,10.55) 132(-2.75,10.55) 133(-3.25,10.55) 134(-3.75,10.55) 135(-4.25,10.55) 136(-4.75,10.55) 137(-5.25,10.55) 138(-5.75,10.55) 139(-6.25,10.55) 140(-6.75,10.55) 141(-7.25,10.55) 142(-7.75,10.55) 143(-8.25,10.55) 144(-8.75,10.55)
  rect 4.3x4.3 smd: 145(0,0)
via 1.8,-1.8 diameter 0.66 hole 0.33
via 0.6,-1.8 diameter 0.66 hole 0.33
via -0.6,-1.8 diameter 0.66 hole 0.33
via -1.8,-1.8 diameter 0.66 hole 0.33
via 1.8,-0.6 diameter 0.66 hole 0.33
via 0.6,-0.6 diameter 0.66 hole 0.33
via -0.6,-0.6 diameter 0.66 hole 0.33
via -1.8,-0.6 diameter 0.66 hole 0.33
via 1.8,0.6 diameter 0.66 hole 0.33
via 0.6,0.6 diameter 0.66 hole 0.33
via -0.6,0.6 diameter 0.66 hole 0.33
via -1.8,0.6 diameter 0.66 hole 0.33
via 1.8,1.8 diameter 0.66 hole 0.33
via 0.6,1.8 diameter 0.66 hole 0.33
via -0.6,1.8 diameter 0.66 hole 0.33
via -1.8,1.8 diameter 0.66 hole 0.33
Top Overlay:
  circle w0.6: c-8.25,8.25 r0.3
  circle w0.25: c-10.55,9.45 r0.125
  lines w0.2: -9.25,-9.25 9.25,-9.25 9.25,9.25 -9.25,9.25 -9.25,-9.25
Mechanical 13:
  circle w0.1: c-9.1,9.1 r0.5
  lines w0.1: -10,-10 10,-10 10,10 -10,10 -10,-10
Mechanical 15:
  lines w0.1: -0.5,0 0.5,0 ; 0,-0.5 0,0.5 ; -11.7,-11.7 11.7,-11.7 11.7,11.7 -11.7,11.7 -11.7,-11.7
3D body "quad144.stp": height 1.5, standoff 0, extent -10.995,-10.998 11.005,11.002

## JEDEC_MS026_BBC_LQFP7X7_48 [mm] "JEDEC_MS026_BBC_LQFP7X7_48"
pads (50):
  rect 0.3x1.45 smd: 1(-2.75,-4.2) 2(-2.25,-4.2) 3(-1.75,-4.2) 4(-1.25,-4.2) 5(-0.75,-4.2) 6(-0.25,-4.2) 7(0.25,-4.2) 8(0.75,-4.2) 9(1.25,-4.2) 10(1.75,-4.2) 11(2.25,-4.2) 12(2.75,-4.2) 25(2.75,4.2) 26(2.25,4.2) 27(1.75,4.2) 28(1.25,4.2) 29(0.75,4.2) 30(0.25,4.2) 31(-0.25,4.2) 32(-0.75,4.2) 33(-1.25,4.2) 34(-1.75,4.2) 35(-2.25,4.2) 36(-2.75,4.2)
  rect 1.45x0.3 smd: 13(4.2,-2.75) 14(4.2,-2.25) 15(4.2,-1.75) 16(4.2,-1.25) 17(4.2,-0.75) 18(4.2,-0.25) 19(4.2,0.25) 20(4.2,0.75) 21(4.2,1.25) 22(4.2,1.75) 23(4.2,2.25) 24(4.2,2.75) 37(-4.2,2.75) 38(-4.2,2.25) 39(-4.2,1.75) 40(-4.2,1.25) 41(-4.2,0.75) 42(-4.2,0.25) 43(-4.2,-0.25) 44(-4.2,-0.75) 45(-4.2,-1.25) 46(-4.2,-1.75) 47(-4.2,-2.25) 48(-4.2,-2.75)
  round 1 smd: " "(-4.2,4.2) " "(4.2,-4.225)
Top Layer keep-out:
  circle w0.025: c-4.175,4.175 r1
  circle w0.025: c4.175,-4.175 r1
Top Overlay:
  circle w0.18: c-2.5,-2.5 r0.5
  lines w0.18: -4.5,-3.25 -3.25,-4.5 -3.25,-3.25 -4.5,-3.25 ; -3.05,-2.8 -3.05,3.05 3.05,3.05 3.05,-3.05 -2.8,-3.05 -3.05,-2.8
Top Solder:
  pour cut-out: -4.175,3.166 -3.914,3.201 -3.671,3.302 -3.462,3.462 -3.302,3.671 -3.201,3.914 -3.166,4.175 -3.201,4.436 -3.302,4.679 -3.462,4.888 -3.671,5.048 -3.914,5.149 -4.175,5.184 -4.436,5.149 -4.679,5.048 -4.888,4.888 -5.048,4.679 -5.149,4.436 -5.184,4.175 -5.149,3.914 -5.048,3.671 -4.888,3.462 -4.679,3.302 -4.436,3.201
  pour cut-out: 4.175,-5.184 4.436,-5.149 4.679,-5.048 4.888,-4.888 5.048,-4.679 5.149,-4.436 5.184,-4.175 5.149,-3.914 5.048,-3.671 4.888,-3.462 4.679,-3.302 4.436,-3.201 4.175,-3.166 3.914,-3.201 3.671,-3.302 3.462,-3.462 3.301,-3.671 3.201,-3.914 3.166,-4.175 3.201,-4.436 3.301,-4.679 3.462,-4.888 3.671,-5.048 3.914,-5.149
Mechanical 6:
  lines w0.18: -4.5,-3.25 -3.25,-4.5 -3.25,-3.25 -4.5,-3.25 ; -3.05,-2.8 -3.05,3.05 3.05,3.05 3.05,-3.05 -2.8,-3.05 -3.05,-2.8 ; -3,-2.5 cw(c-2.5,-2.5) -2.5,-2 cw(c-2.5,-2.5) -2,-2.5 cw(c-2.5,-2.5) -2.5,-3 cw(c-2.5,-2.5) -3,-2.5
Mechanical 8:
  lines w0.025: -1.25,0 1.25,0 ; 0,-1.25 0,1.25
Mechanical 16:
  drawing of 203 lines, arcs and shapes, not listed
Mechanical 18:
  text "24" at 3.325,3 h0.25
  text "22" at 3.325,2 h0.25
  text "23" at 3.325,2.5 h0.25
  text "21" at 3.325,1.5 h0.25
  text "13" at 3.325,-2.5 h0.25
  text "11" at 2.3,-2.825 h0.25
  text "15" at 3.325,-1.5 h0.25
  text "14" at 3.325,-2 h0.25
  text "12" at 2.8,-2.825 h0.25
  text "10" at 1.8,-2.825 h0.25
  text "19" at 3.325,0.5 h0.25
  text "17" at 3.325,-0.5 h0.25
  text "3" at -1.7,-3.075 h0.25
  text "2" at -2.2,-3.075 h0.25
  text "4" at -1.2,-3.075 h0.25
  text "45" at -2.975,-1 h0.25
  text "6" at -0.2,-3.075 h0.25
  text "44" at -2.975,-0.5 h0.25
  text "9" at 1.3,-3.075 h0.25
  text "47" at -2.975,-2 h0.25
  text "43" at -2.975,0 h0.25
  text "7" at 0.3,-3.075 h0.25
  text "42" at -2.975,0.5 h0.25
  text "46" at -2.975,-1.5 h0.25
  text "48" at -2.975,-2.5 h0.25
  text "8" at 0.8,-3.075 h0.25
  text "5" at -0.7,-3.075 h0.25
  text "1" at -2.7,-3.075 h0.25
  text "20" at 3.325,1 h0.25
  text "36" at -2.7,3.325 h0.25
  text "31" at -0.2,3.325 h0.25
  text "29" at 0.8,3.325 h0.25
  text "18" at 3.325,0 h0.25
  text "27" at 1.8,3.325 h0.25
  text "26" at 2.3,3.325 h0.25
  text "38" at -2.975,2.5 h0.25
  text "37" at -2.975,3 h0.25
  text "35" at -2.2,3.325 h0.25
  text "25" at 2.8,3.325 h0.25
  text "30" at 0.3,3.325 h0.25
  text "34" at -1.7,3.325 h0.25
  text "28" at 1.3,3.325 h0.25
  text "16" at 3.325,-1 h0.25
  text "32" at -0.7,3.325 h0.25
  text "33" at -1.2,3.325 h0.25
  text "41" at -2.975,1 h0.25
  text "40" at -2.975,1.5 h0.25
  text "39" at -2.975,2 h0.25
Mechanical 25:
  text "5mm" at 6.5,6.8 h0.25
3D body "lqfp-48l.stp": height 1.6, standoff -0.01, extent -4.5,-4.5 4.5,4.5
3D body "lqfp-48pad.stp": height 0, standoff 0, extent -4.925,2.6 -3.475,2.9
3D body "lqfp-48pad.stp": height 0, standoff 0, extent -4.925,2.1 -3.475,2.4
3D body "lqfp-48pad.stp": height 0, standoff 0, extent -4.925,1.6 -3.475,1.9
3D body "lqfp-48pad.stp": height 0, standoff 0, extent -4.925,1.1 -3.475,1.4
3D body "lqfp-48pad.stp": height 0, standoff 0, extent -4.925,0.6 -3.475,0.9
3D body "lqfp-48pad.stp": height 0, standoff 0, extent -4.925,0.1 -3.475,0.4
3D body "lqfp-48pad.stp": height 0, standoff 0, extent -4.925,-0.4 -3.475,-0.1
3D body "lqfp-48pad.stp": height 0, standoff 0, extent -4.925,-0.9 -3.475,-0.6
3D body "lqfp-48pad.stp": height 0, standoff 0, extent -4.925,-1.4 -3.475,-1.1
3D body "lqfp-48pad.stp": height 0, standoff 0, extent -4.925,-1.9 -3.475,-1.6
3D body "lqfp-48pad.stp": height 0, standoff 0, extent -4.925,-2.4 -3.475,-2.1
3D body "lqfp-48pad.stp": height 0, standoff 0, extent -4.925,-2.9 -3.475,-2.6
3D body "lqfp-48pad.stp": height 0, standoff 0, extent -2.9,-4.925 -2.6,-3.475
3D body "lqfp-48pad.stp": height 0, standoff 0, extent -2.4,-4.925 -2.1,-3.475
3D body "lqfp-48pad.stp": height 0, standoff 0, extent -1.9,-4.925 -1.6,-3.475
3D body "lqfp-48pad.stp": height 0, standoff 0, extent -1.4,-4.925 -1.1,-3.475
3D body "lqfp-48pad.stp": height 0, standoff 0, extent -0.9,-4.925 -0.6,-3.475
3D body "lqfp-48pad.stp": height 0, standoff 0, extent -0.4,-4.925 -0.1,-3.475
3D body "lqfp-48pad.stp": height 0, standoff 0, extent 0.1,-4.925 0.4,-3.475
3D body "lqfp-48pad.stp": height 0, standoff 0, extent 0.6,-4.925 0.9,-3.475
3D body "lqfp-48pad.stp": height 0, standoff 0, extent 1.1,-4.925 1.4,-3.475
3D body "lqfp-48pad.stp": height 0, standoff 0, extent 1.6,-4.925 1.9,-3.475
3D body "lqfp-48pad.stp": height 0, standoff 0, extent 2.1,-4.925 2.4,-3.475
3D body "lqfp-48pad.stp": height 0, standoff 0, extent 2.6,-4.925 2.9,-3.475
3D body "lqfp-48pad.stp": height 0, standoff 0, extent 3.475,-2.9 4.925,-2.6
3D body "lqfp-48pad.stp": height 0, standoff 0, extent 3.475,-2.4 4.925,-2.1
3D body "lqfp-48pad.stp": height 0, standoff 0, extent 3.475,-1.9 4.925,-1.6
3D body "lqfp-48pad.stp": height 0, standoff 0, extent 3.475,-1.4 4.925,-1.1
3D body "lqfp-48pad.stp": height 0, standoff 0, extent 3.475,-0.9 4.925,-0.6
3D body "lqfp-48pad.stp": height 0, standoff 0, extent 3.475,-0.4 4.925,-0.1
3D body "lqfp-48pad.stp": height 0, standoff 0, extent 3.475,0.1 4.925,0.4
3D body "lqfp-48pad.stp": height 0, standoff 0, extent 3.475,0.6 4.925,0.9
3D body "lqfp-48pad.stp": height 0, standoff 0, extent 3.475,1.1 4.925,1.4
3D body "lqfp-48pad.stp": height 0, standoff 0, extent 3.475,1.6 4.925,1.9
3D body "lqfp-48pad.stp": height 0, standoff 0, extent 3.475,2.1 4.925,2.4
3D body "lqfp-48pad.stp": height 0, standoff 0, extent 3.475,2.6 4.925,2.9
3D body "lqfp-48pad.stp": height 0, standoff 0, extent 2.6,3.475 2.9,4.925
3D body "lqfp-48pad.stp": height 0, standoff 0, extent 2.1,3.475 2.4,4.925
3D body "lqfp-48pad.stp": height 0, standoff 0, extent 1.6,3.475 1.9,4.925
3D body "lqfp-48pad.stp": height 0, standoff 0, extent 1.1,3.475 1.4,4.925
3D body "lqfp-48pad.stp": height 0, standoff 0, extent 0.6,3.475 0.9,4.925
3D body "lqfp-48pad.stp": height 0, standoff 0, extent 0.1,3.475 0.4,4.925
3D body "lqfp-48pad.stp": height 0, standoff 0, extent -0.4,3.475 -0.1,4.925
3D body "lqfp-48pad.stp": height 0, standoff 0, extent -0.9,3.475 -0.6,4.925
3D body "lqfp-48pad.stp": height 0, standoff 0, extent -1.4,3.475 -1.1,4.925
3D body "lqfp-48pad.stp": height 0, standoff 0, extent -1.9,3.475 -1.6,4.925
3D body "lqfp-48pad.stp": height 0, standoff 0, extent -2.4,3.475 -2.1,4.925
3D body "lqfp-48pad.stp": height 0, standoff 0, extent -2.9,3.475 -2.6,4.925

## LGA-3X3X0.9 [mm]
pads (10):
  rect 0.4x0.35 smd mask+0.07: 1(-1.2,0.975) 2(-1.2,0.325) 3(-1.2,-0.325) 4(-1.2,-0.975) 6(1.2,-0.975) 7(1.2,-0.325) 8(1.2,0.325) 9(1.2,0.975)
  rect 0.35x0.4 smd mask+0.07: 5(0,-1.2) 10(0,1.2)
Top Overlay:
  circle w0.254: c-1.88,0.991 r0.127
Top Solder:
  region: -1.27,-1.524 -1.524,-1.524 -1.524,-1.27 -1.651,-1.27 -1.651,-1.651 -1.27,-1.651
  region: 1.524,-1.27 1.524,-1.524 1.27,-1.524 1.27,-1.651 1.651,-1.651 1.651,-1.27
  region: 1.27,1.524 1.524,1.524 1.524,1.27 1.651,1.27 1.651,1.651 1.27,1.651
  region: -1.524,1.27 -1.524,1.524 -1.27,1.524 -1.27,1.651 -1.651,1.651 -1.651,1.27
Mechanical 15:
  lines w0.03: -1.5,-1.5 1.5,-1.5 1.5,1.5 -1.5,1.5 -1.5,-1.5
3D body "kxtj9.stp": height 0.91, standoff 0, extent -1.5,-1.5 1.5,1.5

## LGA-3X3X0.86-16L [mm]
pads (16):
  rect 0.25x0.28 smd mask+0.05: 1(-1,-1.23) 2(-0.5,-1.23) 3(0,-1.23) 4(0.5,-1.23) 5(1,-1.23) 9(1,1.23) 10(0.5,1.23) 11(0,1.23) 12(-0.5,1.23) 13(-1,1.23)
  rect 0.28x0.25 smd mask+0.05: 6(1.23,-0.5) 7(1.23,0) 8(1.23,0.5) 14(-1.23,0.5) 15(-1.23,0) 16(-1.23,-0.5)
Top Overlay:
  circle w0.254: c-1.1,-1.9 r0.1
  lines w0.127: -1.6,-1.6 -1.6,1.6 1.6,1.6 1.6,-1.6 -1.6,-1.6
Mechanical 11:
  lines w0.1: -1.5,-1.5 1.5,-1.5 1.5,1.5 -1.5,1.5 -1.5,-1.5
3D body "lga3x3x0_86-16l.stp": height 0.86, standoff 0.01, extent -1.5,-1.5 1.5,1.5

## LQF64 [mm]
pads (64):
  rect 1.2x0.3 smd: 1(-5.75,3.75) 2(-5.75,3.25) 3(-5.75,2.75) 4(-5.75,2.25) 5(-5.75,1.75) 6(-5.75,1.25) 7(-5.75,0.75) 8(-5.75,0.25) 9(-5.75,-0.25) 10(-5.75,-0.75) 11(-5.75,-1.25) 12(-5.75,-1.75) 13(-5.75,-2.25) 14(-5.75,-2.75) 15(-5.75,-3.25) 16(-5.75,-3.75) 33(5.75,-3.75) 34(5.75,-3.25) 35(5.75,-2.75) 36(5.75,-2.25) 37(5.75,-1.75) 38(5.75,-1.25) 39(5.75,-0.75) 40(5.75,-0.25) 41(5.75,0.25) 42(5.75,0.75) 43(5.75,1.25) 44(5.75,1.75) 45(5.75,2.25) 46(5.75,2.75) 47(5.75,3.25) 48(5.75,3.75)
  rect 0.3x1.2 smd: 17(-3.75,-5.75) 18(-3.25,-5.75) 19(-2.75,-5.75) 20(-2.25,-5.75) 21(-1.75,-5.75) 22(-1.25,-5.75) 23(-0.75,-5.75) 24(-0.25,-5.75) 25(0.25,-5.75) 26(0.75,-5.75) 27(1.25,-5.75) 28(1.75,-5.75) 29(2.25,-5.75) 30(2.75,-5.75) 31(3.25,-5.75) 32(3.75,-5.75) 49(3.75,5.75) 50(3.25,5.75) 51(2.75,5.75) 52(2.25,5.75) 53(1.75,5.75) 54(1.25,5.75) 55(0.75,5.75) 56(0.25,5.75) 57(-0.25,5.75) 58(-0.75,5.75) 59(-1.25,5.75) 60(-1.75,5.75) 61(-2.25,5.75) 62(-2.75,5.75) 63(-3.25,5.75) 64(-3.75,5.75)
Top Overlay:
  circle w0.254: c-3.699,3.76 r0.508
  lines w0.2: -4.9,-4.9 4.9,-4.9 4.9,4.9 -3.9,4.9 -4.9,3.9 -4.9,-4.9
3D body "lqfp-64.stp": height 1.6, standoff -0.02, extent -6,-6 6,6

## LQFP44 [mm]
pads (44):
  oval 1.45x0.5 smd: 1(-5.7,4) 2(-5.7,3.2) 3(-5.7,2.4) 4(-5.7,1.6) 5(-5.7,0.8) 6(-5.7,0) 7(-5.7,-0.8) 8(-5.7,-1.6) 9(-5.7,-2.4) 10(-5.7,-3.2) 11(-5.7,-4) 23(5.7,-4) 24(5.7,-3.2) 25(5.7,-2.4) 26(5.7,-1.6) 27(5.7,-0.8) 28(5.7,0) 29(5.7,0.8) 30(5.7,1.6) 31(5.7,2.4) 32(5.7,3.2) 33(5.7,4)
  oval 0.5x1.45 smd: 12(-4,-5.7) 13(-3.2,-5.7) 14(-2.4,-5.7) 15(-1.6,-5.7) 16(-0.8,-5.7) 17(0,-5.7) 18(0.8,-5.7) 19(1.6,-5.7) 20(2.4,-5.7) 21(3.2,-5.7) 22(4,-5.7) 34(4,5.7) 35(3.2,5.7) 36(2.4,5.7) 37(1.6,5.7) 38(0.8,5.7) 39(0,5.7) 40(-0.8,5.7) 41(-1.6,5.7) 42(-2.4,5.7) 43(-3.2,5.7) 44(-4,5.7)
Top Overlay:
  lines w0.1: -6.375,-4.5 -6.375,-6.375 -4.5,-6.375 ; -6.375,4.5 -6.375,5.7 -5.7,6.375 -4.5,6.375 ; 4.5,-6.375 6.375,-6.375 6.375,-4.5 ; 4.5,6.375 6.375,6.375 6.375,4.5
  lines w0.15: -0.381,0 0.381,0 ; 0,-0.381 0,0.356
3D body "lqfp-44.stp": height 1.6, standoff 0, extent -6.082,-6.113 6.112,6.087

## LQFP-44 [mm]
pads (44):
  rect 1.2x0.3 smd: 1(-5.801,4) 2(-5.801,3.2) 3(-5.801,2.4) 4(-5.801,1.6) 5(-5.801,0.8) 6(-5.801,0) 7(-5.801,-0.8) 8(-5.801,-1.6) 9(-5.801,-2.4) 10(-5.801,-3.2) 11(-5.801,-4) 23(5.953,-4) 24(5.953,-3.2) 25(5.953,-2.4) 26(5.953,-1.6) 27(5.953,-0.8) 28(5.953,0) 29(5.953,0.8) 30(5.953,1.6) 31(5.953,2.4) 32(5.953,3.2) 33(5.944,4)
  rect 0.3x1.2 smd: 12(-4,-5.842) 13(-3.2,-5.842) 14(-2.4,-5.801) 15(-1.6,-5.791) 16(-0.8,-5.791) 17(0,-5.826) 18(0.8,-5.826) 19(1.6,-5.817) 20(2.4,-5.791) 21(3.2,-5.867) 22(4,-5.817) 34(4,5.953) 35(3.2,5.953) 36(2.4,5.953) 37(1.6,5.953) 38(0.8,5.953) 39(0,5.953) 40(-0.8,5.953) 41(-1.6,5.953) 42(-2.4,5.953) 43(-3.2,5.953) 44(-4,5.953)
Top Overlay:
  lines w0.254: -5.004,-5.004 5.08,-5.004 5.08,5.004 -5.004,5.004 -5.004,-5.004
3D body "lqfp-44.stp": height 1.6, standoff 0, extent -6.1,-6.097 6.1,6.098